# Altium schematic symbol library SCHLIB.SchLib: 2608 symbols (part 3 of 20) (continued)
## CTE-33 µF-25 V-2917 (continued)
CAP TANT 33UF 10% 25V 2917; Manufacturer Part Number: F931E336KNC; Manufacturer: KYOCERA AVX; Type: Molded; ESR: 700mOhm @ 100kHz; Lifetime @ Temp#: 2000 Hrs @ 125°C; Object  Type: Part; Design Item ID: CTE-33 µF-25 V-2917; Series: F93; Tolerance: ±10%; Operating Temperature: -55°C ~ 125°C; Mounting Type: Surface Mount; Package: 2917; Size: 7.30mm x 4.30mm; Height: 3.00mm; Features: General Purpose; Failure Rate: -; Category: Capacitor; Value: 33 µF
footprint CAPMP7343X310N
pins: 1, 2

## CTE-47 µF-25 V-2917
designator C?, comment Voltage - Rated: 25 V  Manufacturer Size Code: N  (hidden comment: 47 µF)
CAP TANT 47UF 10% 25V 2917; Manufacturer Part Number: F931E476KNC; Manufacturer: KYOCERA AVX; Type: Molded; ESR: 700mOhm @ 100kHz; Lifetime @ Temp#: 2000 Hrs @ 125°C; Object  Type: Part; Design Item ID: CTE-47 µF-25 V-2917; Series: F93; Tolerance: ±10%; Operating Temperature: -55°C ~ 125°C; Mounting Type: Surface Mount; Package: 2917; Size: 7.30mm x 4.30mm; Height: 3.00mm; Features: General Purpose; Failure Rate: -; Category: Capacitor; Value: 47 µF
footprint CAPMP7343X310N
pins: 1, 2

## CTE-68 µF-10 V-1411
designator C?, comment Voltage - Rated: 10 V  Manufacturer Size Code: B  (hidden comment: 68 µF)
CAP TANT 68UF 10% 10V 1411; Manufacturer Part Number: F931A686KBA; Manufacturer: KYOCERA AVX; Type: Molded; ESR: 900mOhm @ 100kHz; Lifetime @ Temp#: 2000 Hrs @ 125°C; Object  Type: Part; Design Item ID: CTE-68 µF-10 V-1411; Series: F93; Tolerance: ±10%; Operating Temperature: -55°C ~ 125°C; Mounting Type: Surface Mount; Package: 1411; Size: 3.50mm x 2.80mm; Height: 2.30mm; Features: General Purpose; Failure Rate: -; Category: Capacitor; Value: 68 µF
footprint CAPMP3528X210N
pins: 1, 2

## CTE-68 µF-10 V-2312
designator C?, comment Voltage - Rated: 10 V  Manufacturer Size Code: C  (hidden comment: 68 µF)
CAP TANT 68UF 10% 10V 2312; Manufacturer Part Number: F931A686KCC; Manufacturer: KYOCERA AVX; Type: Molded; ESR: 800mOhm @ 100kHz; Lifetime @ Temp#: 2000 Hrs @ 125°C; Object  Type: Part; Design Item ID: CTE-68 µF-10 V-2312; Series: F93; Value: 68 µF; Tolerance: ±10%; Operating Temperature: -55°C ~ 125°C; Mounting Type: Surface Mount; Package: 2312; Size: 6.00mm x 3.20mm; Height: 2.80mm; Features: General Purpose; Failure Rate: -; Category: Capacitor
footprint CAPMP6032X280N
pins: 1, 2

## CTE-100 µF-10 V-1411
designator C?, comment Voltage - Rated: 10 V  Manufacturer Size Code: B  (hidden comment: 100 µF)
CAP TANT 100UF 10% 10V 1411; Manufacturer Part Number: F931A107KBA; Manufacturer: KYOCERA AVX; Type: Molded; ESR: 1.2Ohm @ 100kHz; Lifetime @ Temp#: 2000 Hrs @ 125°C; Object  Type: Part; Design Item ID: CTE-100 µF-10 V-1411; Series: F93; Tolerance: ±10%; Operating Temperature: -55°C ~ 125°C; Mounting Type: Surface Mount; Package: 1411; Size: 3.50mm x 2.80mm; Height: 2.30mm; Features: General Purpose; Failure Rate: -; Category: Capacitor; Value: 100 µF
footprint CAPMP3528X210N
pins: 1, 2

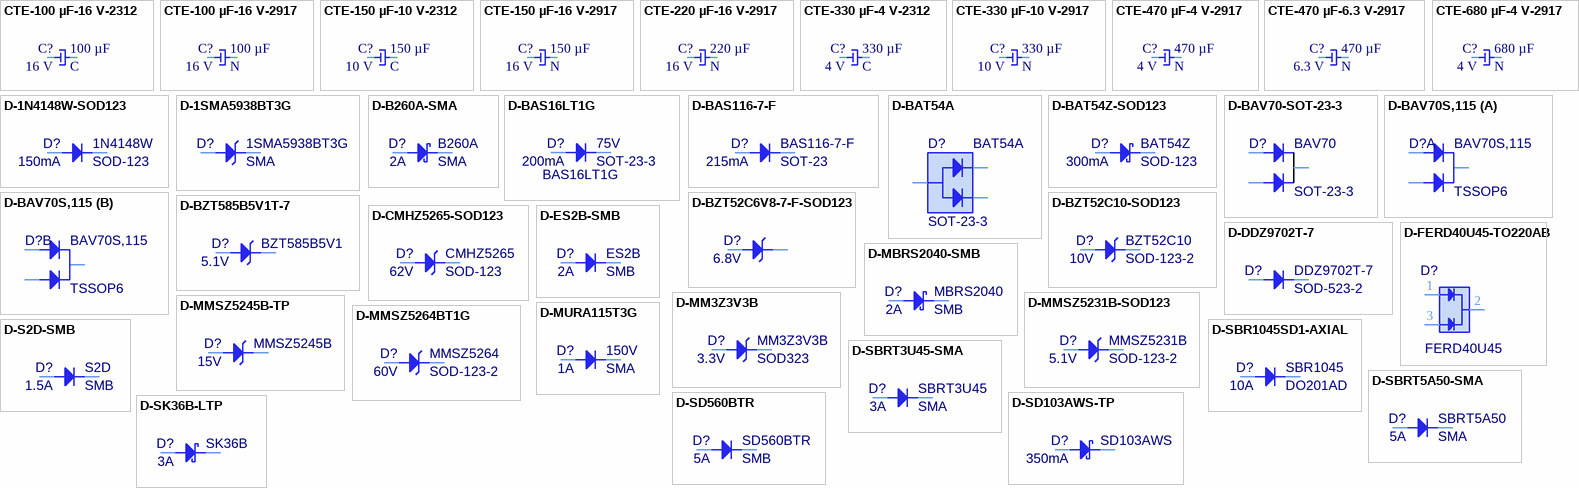
[diagram p11: symbols CTE-100 µF-16 V-2312 to D-SK36B-LTP]

## CTE-100 µF-16 V-2312
designator C?, comment Voltage - Rated: 16 V  Manufacturer Size Code: C  (hidden comment: 100 µF)
CAP TANT 100UF 10% 16V 2312; Manufacturer Part Number: F931C107KCC; Manufacturer: KYOCERA AVX; Type: Molded; ESR: 700mOhm @ 100kHz; Lifetime @ Temp#: 2000 Hrs @ 125°C; Object  Type: Part; Design Item ID: CTE-100 µF-16 V-2312; Series: F93; Tolerance: ±10%; Operating Temperature: -55°C ~ 125°C; Mounting Type: Surface Mount; Package: 2312; Size: 6.00mm x 3.20mm; Height: 2.80mm; Features: General Purpose; Failure Rate: -; Category: Capacitor; Value: 100 µF
footprint CAPMP6032X280N
pins: 1, 2

## CTE-100 µF-16 V-2917
designator C?, comment Voltage - Rated: 16 V  Manufacturer Size Code: N  (hidden comment: 100 µF)
CAP TANT 100UF 10% 16V 2917; Manufacturer Part Number: F931C107KNC; Manufacturer: KYOCERA AVX; Type: Molded; ESR: 600mOhm @ 100kHz; Lifetime @ Temp#: 2000 Hrs @ 125°C; Object  Type: Part; Design Item ID: CTE-100 µF-16 V-2917; Series: F93; Tolerance: ±10%; Operating Temperature: -55°C ~ 125°C; Mounting Type: Surface Mount; Package: 2917; Size: 7.30mm x 4.30mm; Height: 3.00mm; Features: General Purpose; Failure Rate: -; Category: Capacitor; Value: 100 µF
footprint CAPMP7343X310N
pins: 1, 2

## CTE-150 µF-10 V-2312
designator C?, comment Voltage - Rated: 10 V  Manufacturer Size Code: C  (hidden comment: 150 µF)
CAP TANT 150UF 10% 10V 2312; Manufacturer Part Number: F931A157KCC; Manufacturer: KYOCERA AVX; Type: Molded; ESR: 700mOhm @ 100kHz; Lifetime @ Temp#: 2000 Hrs @ 125°C; Object  Type: Part; Design Item ID: CTE-150 µF-10 V-2312; Series: F93; Tolerance: ±10%; Operating Temperature: -55°C ~ 125°C; Mounting Type: Surface Mount; Package: 2312; Size: 6.00mm x 3.20mm; Height: 2.80mm; Features: General Purpose; Failure Rate: -; Category: Capacitor; Value: 150 µF
footprint CAPMP6032X280N
pins: 1, 2

## CTE-150 µF-16 V-2917
designator C?, comment Voltage - Rated: 16 V  Manufacturer Size Code: N  (hidden comment: 150 µF)
CAP TANT 150UF 10% 16V 2917; Manufacturer Part Number: F931C157KNC; Manufacturer: KYOCERA AVX; Type: Molded; ESR: 600mOhm @ 100kHz; Lifetime @ Temp#: 2000 Hrs @ 125°C; Object  Type: Part; Design Item ID: CTE-150 µF-16 V-2917; Series: F93; Tolerance: ±10%; Operating Temperature: -55°C ~ 125°C; Mounting Type: Surface Mount; Package: 2917; Size: 7.30mm x 4.30mm; Height: 3.00mm; Features: General Purpose; Failure Rate: -; Category: Capacitor; Value: 150 µF
footprint CAPMP7343X310N
pins: 1, 2

## CTE-220 µF-16 V-2917
designator C?, comment Voltage - Rated: 16 V  Manufacturer Size Code: N  (hidden comment: 220 µF)
CAP TANT 220UF 10% 16V 2917; Manufacturer Part Number: F931C227KNC; Manufacturer: KYOCERA AVX; Type: Molded; ESR: 700mOhm @ 100kHz; Lifetime @ Temp#: 2000 Hrs @ 125°C; Object  Type: Part; Design Item ID: CTE-220 µF-16 V-2917; Series: F93; Tolerance: ±10%; Operating Temperature: -55°C ~ 125°C; Mounting Type: Surface Mount; Package: 2917; Size: 7.30mm x 4.30mm; Height: 3.00mm; Features: General Purpose; Failure Rate: -; Category: Capacitor; Value: 220 µF
footprint CAPMP7343X310N
pins: 1, 2

## CTE-330 µF-4 V-2312
designator C?, comment Voltage - Rated: 4 V  Manufacturer Size Code: C  (hidden comment: 330 µF)
CAP TANT 330UF 10% 4V 2312; Manufacturer Part Number: F930G337KCC; Manufacturer: KYOCERA AVX; Type: Molded; ESR: 700mOhm @ 100kHz; Lifetime @ Temp#: 2000 Hrs @ 125°C; Object  Type: Part; Design Item ID: CTE-330 µF-4 V-2312; Series: F93; Tolerance: ±10%; Operating Temperature: -55°C ~ 125°C; Mounting Type: Surface Mount; Package: 2312; Size: 6.00mm x 3.20mm; Height: 2.80mm; Features: General Purpose; Failure Rate: -; Category: Capacitor; Value: 330 µF
footprint CAPMP6032X280N
pins: 1, 2

## CTE-330 µF-10 V-2917
designator C?, comment Voltage - Rated: 10 V  Manufacturer Size Code: N  (hidden comment: 330 µF)
CAP TANT 330UF 10% 10V 2917; Manufacturer Part Number: F931A337KNC; Manufacturer: KYOCERA AVX; Type: Molded; ESR: 500mOhm @ 100kHz; Lifetime @ Temp#: 2000 Hrs @ 125°C; Object  Type: Part; Design Item ID: CTE-330 µF-10 V-2917; Series: F93; Value: 330 µF; Tolerance: ±10%; Operating Temperature: -55°C ~ 125°C; Mounting Type: Surface Mount; Package: 2917; Size: 7.30mm x 4.30mm; Height: 3.00mm; Features: General Purpose; Failure Rate: -; Category: Capacitor
footprint CAPMP7343X310N
pins: 1, 2

## CTE-470 µF-4 V-2917
designator C?, comment Voltage - Rated: 4 V  Manufacturer Size Code: N  (hidden comment: 470 µF)
CAP TANT 470UF 10% 4V 2917; Manufacturer Part Number: F930G477KNC; Manufacturer: KYOCERA AVX; Type: Molded; ESR: 300mOhm @ 100kHz; Lifetime @ Temp#: 2000 Hrs @ 125°C; Object  Type: Part; Design Item ID: CTE-470 µF-4 V-2917; Series: F93; Tolerance: ±10%; Operating Temperature: -55°C ~ 125°C; Mounting Type: Surface Mount; Package: 2917; Size: 7.30mm x 4.30mm; Height: 3.00mm; Features: General Purpose; Failure Rate: -; Category: Capacitor; Value: 470 µF
footprint CAPMP7343X310N
pins: 1, 2

## CTE-470 µF-6.3 V-2917
designator C?, comment Voltage - Rated: 6.3 V  Manufacturer Size Code: N  (hidden comment: 470 µF)
CAP TANT 470UF 10% 6.3V 2917; Manufacturer Part Number: F930J477KNC; Manufacturer: KYOCERA AVX; Type: Molded; ESR: 300mOhm @ 100kHz; Lifetime @ Temp#: 2000 Hrs @ 125°C; Object  Type: Part; Design Item ID: CTE-470 µF-6.3 V-2917; Series: F93; Tolerance: ±10%; Operating Temperature: -55°C ~ 125°C; Mounting Type: Surface Mount; Package: 2917; Size: 7.30mm x 4.30mm; Height: 3.00mm; Features: General Purpose; Failure Rate: -; Category: Capacitor; Value: 470 µF
footprint CAPMP7343X310N
pins: 1, 2

## CTE-680 µF-4 V-2917
designator C?, comment Manufacturer Size Code: N  Voltage - Rated: 4 V  (hidden comment: 680 µF)
CAP TANT 680UF 10% 4V 2917; Manufacturer Part Number: F930G687KNC; Manufacturer: KYOCERA AVX; Type: Molded; ESR: 300mOhm @ 100kHz; Lifetime @ Temp#: 2000 Hrs @ 125°C; Object  Type: Part; Design Item ID: CTE-680 µF-4 V-2917; Series: F93; Tolerance: ±10%; Operating Temperature: -55°C ~ 125°C; Mounting Type: Surface Mount; Package: 2917; Size: 7.30mm x 4.30mm; Height: 3.00mm; Features: General Purpose; Failure Rate: -; Category: Capacitor; Value: 680 µF
footprint CAPMP7343X310N
pins: 1, 2

## D-1N4148W-SOD123
designator D?, comment 1N4148W  Forward Current: 150mA  Package / Case: SOD-123
DIODE GEN PURP 100V 150MA SOD123; Manufacturer: MCC; Manufacturer Part Number: 1N4148W-TP; Max Surge Current: 2A; Forward Voltage: 1V; Recovery Time: 4ns; Max Reverse Leakage Current: 5uA; Power Dissipation: 400mW; Max Forward Surge Current (Ifsm): 1A; Element Configuration: Single; Polarity: Standard; Capacitance: 4pF; Washability: OK; Supplier 1: Digi-Key; Stock 1: 1558891; Pricing 1: 1=0.14, 10=0.131, 100=0.0856, 500=0.04186, 1000=0.02854 (USD); Mount: Surface Mount; Number of Pins: 2; Min Operating Temperature: -65°C; Max Operating Temperature: 150°C; Packaging: Tape and Reel; Package Quantity: 3000; Average Rectified Current: 150mA; Reverse Recovery Time: 4ns; Max Repetitive Reverse Voltage (Vrrm): 100V; Peak Non-Repetitive Surge Current: 2A; Voltage Rating (DC): 100V; Current Rating: 150mA; Output Current: 150mA; Max Reverse Voltage (DC): 100V; Length: 2.85mm; Height: 1.2mm; Width: 1.8mm; Radiation Hardening: No; REACH SVHC: Unknown; Lead Free: Lead Free; ComponentLink1URL: http://www.farnell.com/datasheets/1684829.pdf; ComponentLink1Description: http://www.farnell.com/datasheets/1684829.pdf; ComponentLink2URL: http://www.mccsemi.com/up_pdf/1N4148W(SOD123).pdf; ComponentLink2Description: http://www.mccsemi.com/up_pdf/1N4148W(SOD123).pdf; ComponentLink3URL: http://www.mouser.com/ds/2/258/1N4148W(SOD123)-349435.pdf; ComponentLink3Description: http://www.mouser.com/ds/2/258/1N4148W(SOD123)-349435.pdf; ComponentLink4URL: http://www.alliedelec.com/images/products/datasheets/bm/MCC/70055519.pdf; ComponentLink4Description: http://www.alliedelec.com/images/products/datasheets/bm/MCC/70055519.pdf; Supplier Part Number 1: 1N4148WTPMSDKR-ND; Parameter 2: *
footprint D-SOD123
pins: A, C

## D-1SMA5938BT3G
designator D?, comment 1SMA5938BT3G  Case/Package: SMA
DIODE ZENER 36V 1.5W SMA; Manufacturer: ON Semiconductor; Tolerance: 5%; Max Reverse Leakage Current: 500nA; Impedance: 38R; Test Current: 10.4mA; Element Configuration: Single; ESD Protection: Yes; Forward Voltage: 1.5V; Zener Current: 42mA; Power Dissipation: 500mW; Washability: OK; Supplier 1: Digi-Key; Manufacturer Part Number: 1SMA5938BT3G; Stock 1: 6046; Pricing 1: 1=0.5, 10=0.374, 100=0.233, 500=0.15944, 1000=0.12264 (USD); Number of Pins: 2; Contact Plating: Matte,Tin; Min Operating Temperature: -65°C; Max Operating Temperature: 150°C; Max Power Dissipation: 1.5W; Package Quantity: 1; Packaging: Tape and Reel; Zener Voltage: 36V; Voltage Tolerance: 5%; Working Voltage: 36V; Peak Reverse Current: 500nA; Power Rating: 1.5W; Voltage Rating (DC): 36V; Length: 4.57mm; Height: 2.05mm; Width: 2.92mm; Radiation Hardening: No; Lead Free: Lead Free; Halogen Free: Halogen Free; REACH SVHC: No SVHC; ComponentLink1URL: http://www.onsemi.com/pub_link/Collateral/1SMA5913BT3-D.PDF; ComponentLink1Description: http://www.onsemi.com/pub_link/Collateral/1SMA5913BT3-D.PDF; ComponentLink2URL: http://www.onsemi.com/pub/Collateral/1SMA5913BT3-D.PDF; ComponentLink2Description: http://www.onsemi.com/pub/Collateral/1SMA5913BT3-D.PDF; ComponentLink3URL: https://www.onsemi.com/pub/Collateral/1SMA5913BT3-D.PDF; ComponentLink3Description: https://www.onsemi.com/pub/Collateral/1SMA5913BT3-D.PDF; Supplier Part Number 1: 1SMA5938BT3GOSDKR-ND
footprint D-SMA-DO214AC
pins: A, C

## D-B260A-SMA
designator D?, comment B260A  Average Rectified Current: 2A  Case/Package: SMA
DIODE SCHOTTKY 60V 2A SMA; Manufacturer: Diodes; Manufacturer Part Number: B260A-13-F; Forward Voltage: 700mV; Peak Reverse Current: 500uA; Max Forward Surge Current (Ifsm): 50A; Element Configuration: Single; Polarity: Standard; Capacitance: 200pF; Washability: OK; Supplier 1: Digi-Key; Supplier Part Number 1: B260A-FDICT-ND; Stock 1: 380908; Pricing 1: 1=0.48, 10=0.359, 100=0.2239, 500=0.15318, 1000=0.11783 (USD); Mount: Surface Mount; Number of Pins: 2; Weight: 0.002258oz; Contact Plating: Matte,Tin; Min Operating Temperature: -65°C; Max Operating Temperature: 150°C; Packaging: Tape and Reel; Forward Current: 2A; Package Quantity: 5000; Max Repetitive Reverse Voltage (Vrrm): 60V; Peak Non-Repetitive Surge Current: 50A; Termination: SMD/SMT; Voltage Rating (DC): 60V; Current Rating: 2A; Output Current: 2A; Max Reverse Voltage (DC): 60V; Length: 4.6mm; Height: 2.1mm; Width: 2.92mm; Radiation Hardening: No; REACH SVHC: No SVHC; Lead Free: Lead Free; ComponentLink1URL: https://www.verical.com/server-webapp/html/getDatasheet?partID=143171; ComponentLink1Description: https://www.verical.com/server-webapp/html/getDatasheet?partID=143171; ComponentLink2URL: http://www.diodes.com/datasheets/ds13004.pdf; ComponentLink2Description: http://www.diodes.com/datasheets/ds13004.pdf; ComponentLink3URL: http://www.jameco.com/Jameco/Products/ProdDS/1589515.pdf; ComponentLink3Description: http://www.jameco.com/Jameco/Products/ProdDS/1589515.pdf
footprint D-SMA-DO214AC
pins: A, C

## D-BAS16LT1G
designator D?, comment BAS16LT1G  Case/Package: SOT-23-3  Forward Current: 200mA  Voltage Rating (DC): 75V
DIODE GEN PURP 75V 200MA SOT23-3; Manufacturer 1: ON Semiconductor; Element Configuration: Single; Peak Reverse Current: 1uA; Reverse Recovery Time: 6ns; Max Surge Current: 500mA; Forward Voltage: 1.25V; Power Dissipation: 300mW; Polarity: Standard; Capacitance: 2pF; Washability: OK; Supplier 1: Digi-Key; Manufacturer Part Number 1: BAS16LT1G; Stock 1: 1477489; Pricing 1: 1=0,10000, 10=0,09200, 100=0,03850, 500=0,03024, 1000=0,02100 (USD); RoHS: Yes; Number of Pins: 3; Contact Plating: Tin,Matte; Min Operating Temperature: -55°C; Max Operating Temperature: 150°C; Max Repetitive Reverse Voltage (Vrrm): 75V; Recovery Time: 6ns; Package Quantity: 1; Packaging: Tape and Reel; Max Reverse Leakage Current: 1uA; Average Rectified Current: 200mA; Max Reverse Voltage (DC): 75V; Peak Non-Repetitive Surge Current: 500mA; Max Forward Surge Current (Ifsm): 500mA; Current Rating: 200mA; Output Current: 200mA; Length: 0.119inch; Height: 0.04inch; Width: 0.055inch; Radiation Hardening: No; Lead Free: Lead Free; Halogen Free: Halogen Free; REACH SVHC: No SVHC; ComponentLink1URL: https://datasheet.ciiva.com/4434/bas16lt1-d-103448-4434931.pdf?src-supplier=Mouser; ComponentLink1Description: https://datasheet.ciiva.com/4434/bas16lt1-d-103448-4434931.pdf?src-supplier=Mouser; ComponentLink2URL: https://datasheet.ciiva.com/915/bas16lt1-d-915318.pdf?src-supplier=Digi-Key; ComponentLink2Description: https://datasheet.ciiva.com/915/bas16lt1-d-915318.pdf?src-supplier=Digi-Key; ComponentLink3URL: https://datasheet.ciiva.com/1179/bas16lt1-d-1179718.pdf?src-supplier=Element14; ComponentLink3Description: https://datasheet.ciiva.com/1179/bas16lt1-d-1179718.pdf?src-supplier=Element14; ComponentLink4URL: https://datasheet.ciiva.com/8291/bas16lt1-d-8291894.pdf?src-supplier=Avnet; ComponentLink4Description: https://datasheet.ciiva.com/8291/bas16lt1-d-8291894.pdf?src-supplier=Avnet; ComponentLink5URL: https://datasheet.ciiva.com/915/bas16lt1-d-915319.pdf?src-supplier=Digi-Key; ComponentLink5Description: https://datasheet.ciiva.com/915/bas16lt1-d-915319.pdf?src-supplier=Digi-Key; ComponentLink6URL: https://datasheet.ciiva.com/1179/bas16lt1-d-1179719.pdf?src-supplier=Element14; ComponentLink6Description: https://datasheet.ciiva.com/1179/bas16lt1-d-1179719.pdf?src-supplier=Element14; ComponentLink7URL: https://datasheet.ciiva.com/915/bas16lt1-d-915320.pdf?src-supplier=Digi-Key; ComponentLink7Description: https://datasheet.ciiva.com/915/bas16lt1-d-915320.pdf?src-supplier=Digi-Key; ComponentLink8URL: https://datasheet.ciiva.com/16387/bas16lt1-d-16387673.pdf?src-supplier=Future+Electronics; ComponentLink8Description: https://datasheet.ciiva.com/16387/bas16lt1-d-16387673.pdf?src-supplier=Future+Electronics; ComponentLink9URL: https://datasheet.ciiva.com/22663/1708231-22663642.pdf?src-supplier=Element14; ComponentLink9Description: https://datasheet.ciiva.com/22663/1708231-22663642.pdf?src-supplier=Element14; ComponentLink10URL: https://datasheet.ciiva.com/25950/bas16lt1-d-25950207.pdf?src-supplier=Avnet+Europe; ComponentLink10Description: https://datasheet.ciiva.com/25950/bas16lt1-d-25950207.pdf?src-supplier=Avnet+Europe; Supplier Part Number 1: BAS16LT1GOSCT-ND
footprint SOT23-3
pins: 1 A, 3 K

## D-BAS116-7-F
designator D?, comment BAS116-7-F  Case/Package: SOT-23  Forward Current: 215mA
DIODE GEN PURP 85V 215MA SOT23-3; Manufacturer: Diodes; Reverse Recovery Time: 3us; Peak Non-Repetitive Surge Current: 4A; Element Configuration: Single; Forward Voltage: 1.25V; Max Reverse Current: 5nA; Max Power Dissipation: 150mW; Power Dissipation: 250mW; Polarity: Standard; Capacitance: 2pF; Output Current: 250mA; Supplier 1: Digi-Key; Manufacturer Part Number: BAS116-7-F; Stock 1: 48988; Pricing 1: 1=0,20000, 10=0,17700, 100=0,08340, 500=0,04950, 1000=0,03323 (USD); RoHS: Yes; Mount: Surface Mount; Number of Pins: 3; Weight: 0.000282oz; Contact Plating: Tin,Matte; Min Operating Temperature: -65°C; Max Operating Temperature: 150°C; Max Repetitive Reverse Voltage (Vrrm): 85V; Max Surge Current: 4A; Package Quantity: 3000; Packaging: Tape and Reel; Recovery Time: 3us; Reverse Voltage (DC): 85V; Average Rectified Current: 215mA; Max Forward Surge Current (Ifsm): 4A; Voltage Rating (DC): 85V; Power Rating: 250mW; Current Rating: 215mA; Max Reverse Voltage (DC): 85V; Length: 3.05mm; Height: 1mm; Width: 1.4mm; Radiation Hardening: No; REACH SVHC: No SVHC; Lead Free: Lead Free; ComponentLink1URL: https://datasheet.ciiva.com/911/ds30233-911846.pdf?src-supplier=Digi-Key; ComponentLink1Description: https://datasheet.ciiva.com/911/ds30233-911846.pdf?src-supplier=Digi-Key; ComponentLink2URL: https://datasheet.ciiva.com/1179/ds30233-1179654.pdf?src-supplier=Element14; ComponentLink2Description: https://datasheet.ciiva.com/1179/ds30233-1179654.pdf?src-supplier=Element14; ComponentLink3URL: https://datasheet.ciiva.com/15144/getdatasheetpartid-35589-15144022.pdf?src-supplier=Verical; ComponentLink3Description: https://datasheet.ciiva.com/15144/getdatasheetpartid-35589-15144022.pdf?src-supplier=Verical; ComponentLink4URL: https://datasheet.ciiva.com/911/ds30233-911847.pdf?src-supplier=Digi-Key; ComponentLink4Description: https://datasheet.ciiva.com/911/ds30233-911847.pdf?src-supplier=Digi-Key; ComponentLink5URL: https://datasheet.ciiva.com/911/ds30233-911848.pdf?src-supplier=Digi-Key; ComponentLink5Description: https://datasheet.ciiva.com/911/ds30233-911848.pdf?src-supplier=Digi-Key; ComponentLink6URL: https://datasheet.ciiva.com/4453/ds30233-18535-4453579.pdf?src-supplier=Mouser; ComponentLink6Description: https://datasheet.ciiva.com/4453/ds30233-18535-4453579.pdf?src-supplier=Mouser; ComponentLink7URL: https://datasheet.ciiva.com/8303/ds30233-8303195.pdf?src-supplier=Avnet; ComponentLink7Description: https://datasheet.ciiva.com/8303/ds30233-8303195.pdf?src-supplier=Avnet
footprint SOT23-3
pins: A, C

## D-BAT54A
designator D?, comment BAT54A  Case/Package: SOT-23-3
DIODE ARRAY SCHOTTKY 30V SOT23-3; Manufacturer: ON Semiconductor / Fairchild; Forward Voltage: 800mV; Element Configuration: Common Anode; Current Rating: 200mA; Reverse Recovery Time: 5ns; Max Forward Surge Current (Ifsm): 600mA; Capacitance: 10pF; Peak Reverse Current: 2uA; Power Dissipation: 290mW; Washability: OK; Supplier 1: Digi-Key; Manufacturer Part Number: BAT54A; Stock 1: 29533; Pricing 1: 1=0.28, 10=0.23, 100=0.122, 500=0.08028, 1000=0.05459 (USD); Mount: Surface Mount; Number of Pins: 3; Weight: 0.025g; Contact Plating: Matte,Tin; Min Operating Temperature: -55°C; Max Operating Temperature: 150°C; Packaging: Tape and Reel; Voltage Rating (DC): 30V; Forward Current: 200mA; Max Repetitive Reverse Voltage (Vrrm): 30V; Package Quantity: 1; Peak Non-Repetitive Surge Current: 600mA; Average Rectified Current: 200mA; Max Reverse Voltage (DC): 30V; Length: 2.92mm; Height: 0.93mm; Width: 1.3mm; Radiation Hardening: No; REACH SVHC: No SVHC; Lead Free: Lead Free; ComponentLink1URL: http://www.farnell.com/datasheets/2285880.pdf; ComponentLink1Description: http://www.farnell.com/datasheets/2285880.pdf; ComponentLink2URL: https://www.fairchildsemi.com/package-drawings/MA/MA03B.pdf; ComponentLink2Description: https://www.fairchildsemi.com/package-drawings/MA/MA03B.pdf; ComponentLink3URL: http://www.fairchildsemi.com/ds/BA/BAT54A.pdf; ComponentLink3Description: http://www.fairchildsemi.com/ds/BA/BAT54A.pdf; ComponentLink4URL: https://www.verical.com/server-webapp/html/getDatasheet?partID=86888; ComponentLink4Description: https://www.verical.com/server-webapp/html/getDatasheet?partID=86888; ComponentLink5URL: https://media.digikey.com/pdf/Data%20Sheets/ON%20Semiconductor%20PDFs/BAT54(A,C,S).pdf; ComponentLink5Description: https://media.digikey.com/pdf/Data%20Sheets/ON%20Semiconductor%20PDFs/BAT54(A,C,S).pdf; Supplier Part Number 1: BAT54AFSDKR-ND
footprint SOT23-3
pins: 1, 2, 3

## D-BAT54Z-SOD123
designator D?, comment BAT54Z  Average Rectified Current: 300mA  Package / Case: SOD-123
DIODE SCHOTTKY 40V 300MA SOD123; Manufacturer: STMicroelectronics; Manufacturer Part Number: BAT54ZFILM; Forward Voltage: 900mV; Max Surge Current: 1A; Recovery Time: 5ns; Max Reverse Leakage Current: 1uA; Peak Reverse Current: 100uA; Element Configuration: Single; Polarity: Standard; Capacitance: 7pF; Washability: OK; Supplier 1: Digi-Key; Supplier Part Number 1: 497-5562-6-ND; Stock 1: 43044; Pricing 1: 1=0.35, 10=0.26, 100=0.147, 500=0.09734, 1000=0.07462 (USD); Mount: Surface Mount; Number of Pins: 2; Contact Plating: Matte,Tin; Min Operating Temperature: -40°C; Max Operating Temperature: 150°C; Package Quantity: 1; Packaging: Tape and Reel; Reverse Recovery Time: 5ns; Max Repetitive Reverse Voltage (Vrrm): 40V; Peak Non-Repetitive Surge Current: 1A; Voltage Rating (DC): 40V; Current Rating: 300mA; Output Current: 300mA; Forward Current: 300mA; Max Reverse Voltage (DC): 40V; Lead Free: Lead Free; ComponentLink1URL: http://www.st.com/web/en/resource/technical/document/datasheet/CD00001322.pdf; ComponentLink1Description: http://www.st.com/web/en/resource/technical/document/datasheet/CD00001322.pdf; ComponentLink2URL: http://www.st.com/content/ccc/resource/technical/document/datasheet/07/50/54/f2/0d/ba/4a/79/CD00001322.pdf/files/CD00001322.pdf/jcr:content/translations/en.CD00001322.pdf; ComponentLink2Description: http://www.st.com/content/ccc/resource/technical/document/datasheet/07/50/54/f2/0d/ba/4a/79/CD00001322.pdf/files/CD00001322.pdf/jcr:content/translations/en.CD00001322.pdf
footprint D-SOD123
pins: A, C

## D-BAV70-SOT-23-3
designator D?, comment BAV70  Case/Package: SOT-23-3
DIODE ARRAY GP 80V 200MA SOT23-3 3; Manufacturer: Panasonic; Max Surge Current: 500mA; Recovery Time: 2ns; Element Configuration: Common Cathode; Max Reverse Leakage Current: 100nA; Voltage Rating (DC): 70V; Capacitance: 1.5pF; Forward Voltage: 1V; Washability: OK; Supplier 1: Digi-Key; Supplier Part Number 1: BAV70PSCT-ND; Manufacturer Part Number: BAV70; Stock 1: 0; Mount: Surface Mount; Number of Pins: 3; Min Operating Temperature: -40°C; Max Operating Temperature: 85°C; Packaging: Tape and Reel; Package Quantity: 3000; Average Rectified Current: 200mA; Current Rating: 200mA; Max Reverse Voltage (DC): 80V; REACH SVHC: No SVHC; Lead Free: Lead Free; ComponentLink1URL: http://www.mouser.com/ds/2/315/BAV70_E-472112.pdf; ComponentLink1Description: http://www.mouser.com/ds/2/315/BAV70_E-472112.pdf
footprint SOT23-3
pins: 1, 2, 3

## D-BAV70S,115
designator D?, comment BAV70S,115  Case/Package: TSSOP6
DIODE ARRAY GP 100V 250MA 6TSSOP; Manufacturer: NXP Semiconductors; Element Configuration: Common Cathode; Forward Voltage: 1.25V; Reverse Recovery Time: 4ns; Peak Non-Repetitive Surge Current: 4A; Peak Reverse Current: 500nA; Power Dissipation: 350mW; Washability: OK; Supplier 1: Digi-Key; Manufacturer Part Number: BAV70S,115; Stock 1: 142855; Pricing 1: 1=0.42, 10=0.315, 100=0.1786, 500=0.11828, 1000=0.09068 (USD); Mount: Surface Mount; Number of Pins: 6; Weight: 0.01lb; Contact Plating: Tin; Min Operating Temperature: -65°C; Max Operating Temperature: 150°C; Packaging: Tape and Reel; Forward Current: 250mA; Max Repetitive Reverse Voltage (Vrrm): 100V; Package Quantity: 1; Max Surge Current: 4A; Recovery Time: 4ns; Average Rectified Current: 250mA; Max Reverse Leakage Current: 500nA; Max Forward Surge Current (Ifsm): 4A; Max Reverse Voltage (DC): 100V; Length: 2.2mm; Height: 1mm; Width: 1.35mm; Radiation Hardening: No; REACH SVHC: No SVHC; Lead Free: Lead Free; ComponentLink1URL: http://www.nxp.com/documents/data_sheet/BAV70_SER.pdf; ComponentLink1Description: http://www.nxp.com/documents/data_sheet/BAV70_SER.pdf; ComponentLink2URL: http://www.farnell.com/datasheets/1914003.pdf; ComponentLink2Description: http://www.farnell.com/datasheets/1914003.pdf; Supplier Part Number 1: 1727-4310-6-ND
footprint TSSOP6(SOT363)
part A pins: 1, 2, 6
part B pins: 3, 4, 5

## D-BZT52C6V8-7-F-SOD123
designator D?, comment Voltage Rating (DC): 6.8V  (hidden comment: BZT52C6V8)
DIODE ZENER 6.8V 500MW SOD123; Manufacturer: Diodes; Manufacturer Part Number: BZT52C6V8-7-F; Max Reverse Leakage Current: 2uA; Element Configuration: Single; Tolerance: 6%; Forward Voltage: 900mV; Impedance: 15R; Zener Current: 5mA; Output Current: 45mA; ESD Protection: No; Washability: OK; Supplier 1: Digi-Key; Stock 1: 28515; Pricing 1: 1=0.20000, 10=0.16600, 100=0.08810, 500=0.05794, 1000=0.03940 (USD); RoHS: Yes; Mount: Surface Mount; Number of Pins: 2; Weight: 0.000353oz; Contact Plating: Tin,Matte; Min Operating Temperature: -65°C; Max Operating Temperature: 150°C; Max Power Dissipation: 500mW; Zener Voltage: 6.8V; Packaging: Tape and Reel; Package Quantity: 3000; Power Dissipation: 500mW; Voltage Tolerance: 6%; Test Current: 5mA; Working Voltage: 6.8V; Peak Reverse Current: 2uA; Termination: SMD/SMT; Power Rating: 500mW; Length: 2.85mm; Height: 1.35mm; Width: 1.7mm; Radiation Hardening: No; Lead Free: Lead Free; ComponentLink1URL: https://datasheet.ciiva.com/15142/getdatasheetpartid-61176-15142294.pdf?src-supplier=Verical; ComponentLink1Description: https://datasheet.ciiva.com/15142/getdatasheetpartid-61176-15142294.pdf?src-supplier=Verical; ComponentLink2URL: https://datasheet.ciiva.com/25623/0900766b8104bde6-25623750.pdf?src-supplier=RSComponents; ComponentLink2Description: https://datasheet.ciiva.com/25623/0900766b8104bde6-25623750.pdf?src-supplier=RSComponents; Supplier Part Number 1: BZT52C6V8-FDICT-ND
footprint D-SOD123
pins: A, C

## D-BZT52C10-SOD123
designator D?, comment BZT52C10  Zener Voltage: 10V  Case/Package: SOD-123-2
DIODE ZENER 10V 500MW SOD123; Manufacturer: Diodes; Manufacturer Part Number: BZT52C10-7-F; Tolerance: 6%; Forward Voltage: 900mV; Impedance: 20R; Zener Current: 5mA; Peak Reverse Current: 200nA; Element Configuration: Single; Output Current: 50mA; ESD Protection: No; Forward Current: 250mA; Reverse Recovery Time: 4ns; Max Repetitive Reverse Voltage (Vrrm): 100V; Peak Non-Repetitive Surge Current: 4A; Washability: OK; Supplier 1: Digi-Key; Supplier Part Number 1: BZT52C10-FDIDKR-ND; Stock 1: 339; Pricing 1: 1=0.24, 10=0.218, 100=0.1186, 500=0.07296, 1000=0.04975 (USD); Mount: Surface Mount; Number of Pins: 2; Weight: 0.000353oz; Contact Plating: Matte,Tin; Min Operating Temperature: -65°C; Max Operating Temperature: 150°C; Package Quantity: 3000; Packaging: Tape and Reel; Max Power Dissipation: 500mW; Voltage Tolerance: 6%; Test Current: 5mA; Power Dissipation: 500mW; Max Reverse Leakage Current: 200nA; Working Voltage: 10V; Termination: SMD/SMT; Power Rating: 500mW; Voltage Rating (DC): 10V; Length: 2.85mm; Height: 1.35mm; Width: 1.7mm; Radiation Hardening: No; Lead Free: Lead Free; ComponentLink1URL: https://www.diodes.com/assets/Datasheets/ds18004.pdf; ComponentLink1Description: https://www.diodes.com/assets/Datasheets/ds18004.pdf; ComponentLink2URL: http://www.jameco.com/Jameco/Products/ProdDS/1539497.pdf; ComponentLink2Description: http://www.jameco.com/Jameco/Products/ProdDS/1539497.pdf; Supplier 2: Digi-Key; Supplier Part Number 2: MMSZ5240B-FDIDKR-ND; Stock 2: 34933; Pricing 2: 1=0.25, 10=0.204, 100=0.108, 500=0.07108, 1000=0.04833 (USD); ComponentLink3URL: https://www.verical.com/server-webapp/html/getDatasheet?partID=110273; ComponentLink3Description: https://www.verical.com/server-webapp/html/getDatasheet?partID=110273; ComponentLink4URL: http://www.diodes.com/_files/datasheets/ds18010.pdf; ComponentLink4Description: http://www.diodes.com/_files/datasheets/ds18010.pdf; ComponentLink5URL: http://www.jameco.com/Jameco/Products/ProdDS/1541167.pdf; ComponentLink5Description: http://www.jameco.com/Jameco/Products/ProdDS/1541167.pdf; Supplier 3: Digi-Key; Supplier Part Number 3: MMSZ5240B-HE3-08GICT-ND; Stock 3: 14290; Pricing 3: 1=0.3, 10=0.244, 25=0.2044, 100=0.1295, 250=0.09992, 500=0.08516, 1000=0.05791 (USD); ComponentLink6URL: http://www.mouser.com/ds/2/427/mmsz5225-102133.pdf; ComponentLink6Description: http://www.mouser.com/ds/2/427/mmsz5225-102133.pdf; Max Surge Current: 4A; Recovery Time: 4ns; Average Rectified Current: 250mA; Max Forward Surge Current (Ifsm): 4A; Max Reverse Voltage (DC): 100V; REACH SVHC: No SVHC; ComponentLink7URL: http://www.nxp.com/documents/data_sheet/BAV70_SER.pdf; ComponentLink7Description: http://www.nxp.com/documents/data_sheet/BAV70_SER.pdf; ComponentLink8URL: http://www.farnell.com/datasheets/1914003.pdf; ComponentLink8Description: http://www.farnell.com/datasheets/1914003.pdf
footprint D-SOD123
pins: A, C

## D-BZT585B5V1T-7
designator D?, comment BZT585B5V1  Zener Voltage: 5.1V
DIODE ZENER 5.1V 350MW SOD523; Manufacturer: Diodes; Manufacturer Part Number: BZT585B5V1T-7; Impedance: 60R; Tolerance: 2%; Element Configuration: Single; Zener Current: 5mA; Peak Reverse Current: 2uA; Forward Voltage: 900mV; ESD Protection: No; Washability: OK; Supplier 1: Digi-Key; Stock 1: 6784; Pricing 1: 1=0.22000, 10=0.18000, 100=0.09570, 500=0.06296, 1000=0.04281 (USD); RoHS: Yes; Mount: Surface Mount; Case/Package: SOD-523-2; Number of Pins: 2; Weight: 3.5E-05oz; Contact Plating: Tin,Matte; Min Operating Temperature: -65°C; Max Operating Temperature: 150°C; Packaging: Tape and Reel; Max Power Dissipation: 350mW; Voltage Tolerance: 2%; Package Quantity: 3000; Max Reverse Leakage Current: 2uA; Test Current: 5mA; ComponentLink1URL: http://www.mouser.com/ds/2/115/BZT585BxVxT-318149.pdf?src-supplier=Mouser; ComponentLink1Description: http://www.mouser.com/ds/2/115/BZT585BxVxT-318149.pdf?src-supplier=Mouser; ComponentLink2URL: https://www.diodes.com/assets/Datasheets/BZT585BxVxT.pdf?src-supplier=Digi-Key; ComponentLink2Description: https://www.diodes.com/assets/Datasheets/BZT585BxVxT.pdf?src-supplier=Digi-Key; ComponentLink3URL: http://diodes.com/datasheets/BZT585BxVxT.pdf?src-supplier=Avnet; ComponentLink3Description: http://diodes.com/datasheets/BZT585BxVxT.pdf?src-supplier=Avnet; Supplier Part Number 1: BZT585B5V1T-7DICT-ND
footprint D-SOD523
pins: A, C

## D-CMHZ5265-SOD123
designator D?, comment CMHZ5265  Zener Voltage: 62V  Package / Case: SOD-123
DIODE ZENER 62V 250MW SOD123; Manufacturer: Central Semiconductor; Manufacturer Part Number: CMHZ5265BTR; Impedance: 185R; Tolerance: 5%; Material: Plastic; Max Reverse Leakage Current: 100nA; Test Current: 2mA; Element Configuration: Single; Forward Voltage: 900mV; Power Dissipation: 500mW; Zener Current: 10mA; ESD Protection: Yes; Washability: OK; Supplier 1: Digi-Key; Supplier Part Number 1: CMHZ5265BDKR-ND; Stock 1: 29816; Pricing 1: 1=0.49, 10=0.415, 25=0.3632, 100=0.3115, 250=0.26996, 500=0.22842, 1000=0.1765 (USD); Mount: Surface Mount; Min Operating Temperature: -65°C; Max Operating Temperature: 150°C; Packaging: Tape and Reel; Max Power Dissipation: 250mW; Supplier 2: Digi-Key; Supplier Part Number 2: MMSZ5265BT1GOSDKR-ND; Stock 2: 630; Pricing 2: 1=0.25, 10=0.201, 100=0.1067, 500=0.07016, 1000=0.04771 (USD); Case/Package: SOD-123-2; Number of Pins: 2; Contact Plating: Matte,Tin; Package Quantity: 1; Voltage Tolerance: 5%; Working Voltage: 62V; Peak Reverse Current: 100nA; Voltage Rating (DC): 62V; Power Rating: 500mW; Length: 2.84mm; Height: 1.25mm; Width: 1.8mm; Radiation Hardening: No; Lead Free: Lead Free; REACH SVHC: No SVHC; ComponentLink1URL: https://www.verical.com/server-webapp/html/getDatasheet?partID=75754; ComponentLink1Description: https://www.verical.com/server-webapp/html/getDatasheet?partID=75754; ComponentLink2URL: http://www.onsemi.com/pub/Collateral/MMSZ5221BT1-D.PDF; ComponentLink2Description: http://www.onsemi.com/pub/Collateral/MMSZ5221BT1-D.PDF; ComponentLink3URL: http://www.farnell.com/datasheets/661777.pdf; ComponentLink3Description: http://www.farnell.com/datasheets/661777.pdf; ComponentLink4URL: http://www.mouser.com/ds/2/308/MMSZ5221BT1-D-85810.pdf; ComponentLink4Description: http://www.mouser.com/ds/2/308/MMSZ5221BT1-D-85810.pdf
footprint D-SOD123
pins: A, C

## D-DDZ9702T-7
designator D?, comment DDZ9702T-7  Case/Package: SOD-523-2
DIODE ZENER 15V 150MW SOD523; Manufacturer: Diodes; Max Reverse Leakage Current: 50nA; Element Configuration: Single; Tolerance: 5%; Test Current: 50uA; Forward Voltage: 900mV; Washability: OK; Supplier 1: Digi-Key; Manufacturer Part Number: DDZ9702T-7; Stock 1: 53168; Pricing 1: 1=0.51, 10=0.379, 100=0.2146, 500=0.14214, 1000=0.10897 (USD); Mount: Surface Mount; Number of Pins: 2; Weight: 3.5E-05oz; Min Operating Temperature: -65°C; Max Operating Temperature: 150°C; Max Power Dissipation: 150mW; Zener Voltage: 15V; Package Quantity: 3000; Packaging: Tape and Reel; Voltage Tolerance: 5%; Power Dissipation: 150mW; Zener Current: 50nA; Peak Reverse Current: 50nA; Power Rating: 150mW; Length: 1.7mm; Height: 0.65mm; Width: 0.9mm; Radiation Hardening: No; Lead Free: Lead Free; ComponentLink1URL: http://www.diodes.com///datasheets/ds30553.pdf; ComponentLink1Description: http://www.diodes.com///datasheets/ds30553.pdf; Supplier Part Number 1: DDZ9702T-7DIDKR-ND
pins: A, C

## D-ES2B-SMB
designator D?, comment ES2B  Forward Current: 2A  Case/Package: SMB
DIODE GEN PURP 100V 2A DO214AA-SMB; Manufacturer: ON Semiconductor / Fairchild; Forward Voltage: 900mV; Polarity: Standard; Capacitance: 18pF; Max Surge Current: 50A; Peak Reverse Current: 10uA; Recovery Time: 20ns; Power Dissipation: 1.66W; Element Configuration: Single; Washability: OK; Supplier 1: Digi-Key; Supplier Part Number 1: ES2BFSDKR-ND; Manufacturer Part Number: ES2B; Stock 1: 8342; Pricing 1: 1=0.46, 10=0.371, 100=0.2526, 500=0.18948, 1000=0.14211 (USD); Mount: Surface Mount; Number of Pins: 2; Weight: 0.18g; Min Operating Temperature: -55°C; Max Operating Temperature: 150°C; Packaging: Tape and Reel; Voltage Rating (DC): 100V; Current Rating: 2A; Output Current: 2A; Package Quantity: 1; Average Rectified Current: 2A; Reverse Recovery Time: 20ns; Max Repetitive Reverse Voltage (Vrrm): 100V; Peak Non-Repetitive Surge Current: 50A; Max Forward Surge Current (Ifsm): 50A; Reverse Voltage: 100V; Max Reverse Voltage (DC): 100V; Length: 4.75mm; Height: 2.45mm; Width: 3.95mm; Radiation Hardening: No; REACH SVHC: No SVHC; Lead Free: Lead Free; ComponentLink1URL: http://www.jameco.com/Jameco/Products/ProdDS/1220689.pdf; ComponentLink1Description: http://www.jameco.com/Jameco/Products/ProdDS/1220689.pdf; ComponentLink2URL: https://www.fairchildsemi.com/datasheets/ES/ES2D.pdf; ComponentLink2Description: https://www.fairchildsemi.com/datasheets/ES/ES2D.pdf; ComponentLink3URL: http://www.mouser.com/ds/2/149/ES2B-190295.pdf; ComponentLink3Description: http://www.mouser.com/ds/2/149/ES2B-190295.pdf; ComponentLink4URL: https://www.fairchildsemi.com/package-drawings/DO/DO214AA.pdf; ComponentLink4Description: https://www.fairchildsemi.com/package-drawings/DO/DO214AA.pdf; ComponentLink5URL: http://www.farnell.com/datasheets/1845305.pdf; ComponentLink5Description: http://www.farnell.com/datasheets/1845305.pdf
footprint D-SMB-DO214AA
pins: A, C

## D-FERD40U45-TO220AB
designator D?, comment FERD40U45
DIODE ARRAY 45V 20A TO220AB; Manufacturer: STMicroelectronics; Manufacturer Part Number: FERD40U45CT; Element Configuration: Common Cathode; Peak Reverse Current: 50mA; Max Surge Current: 275A; Forward Current: 40A; Forward Voltage: 460mV; Washability: OK; Supplier 1: Digi-Key; Supplier Part Number 1: 497-14549-5-ND; Stock 1: 0; Pricing 1: 1=1.67, 50=1.4122, 100=1.2032, 500=0.98858, 1000=0.81911 (USD); Mount: Through Hole; Number of Pins: 3; Weight: 0.08113oz; Min Operating Temperature: -65°C; Max Operating Temperature: 175°C; Packaging: Rail/Tube; Package Quantity: 50; Reverse Voltage (DC): 45V; Average Rectified Current: 20A; Max Repetitive Reverse Voltage (Vrrm): 45V; Peak Non-Repetitive Surge Current: 275A; Max Reverse Voltage (DC): 45V; Radiation Hardening: No; Lead Free: Lead Free; ComponentLink1URL: http://www.st.com/content/ccc/resource/sales_and_marketing/promotional_material/selection_guide/38/a9/c4/c4/46/f9/40/ff/sgdiodrect0413.pdf/files/sgdiodrect0413.pdf/jcr:content/translations/en.sgdiodrect0413.pdf; ComponentLink1Description: http://www.st.com/content/ccc/resource/sales_and_marketing/promotional_material/selection_guide/38/a9/c4/c4/46/f9/40/ff/sgdiodrect0413.pdf/files/sgdiodrect0413.pdf/jcr:content/translations/en.sgdiodrect0413.pdf; Case/Package: TO-220AB
footprint TO-220AB
pins: 1 A1, 2 C, 3 A2

## D-MBRS2040-SMB
designator D?, comment MBRS2040  Average Rectified Current: 2A  Case/Package: SMB
DIODE SCHOTTKY 40V 2A SMB; Manufacturer: ON Semiconductor; Manufacturer Part Number: MBRS2040LT3G; Max Surge Current: 70A; Forward Voltage: 430mV; Peak Reverse Current: 800uA; Element Configuration: Single; Polarity: Standard; Washability: OK; Supplier 1: Digi-Key; Supplier Part Number 1: MBRS2040LT3GOSDKR-ND; Stock 1: 41045; Pricing 1: 1=0.43, 10=0.346, 100=0.2353, 500=0.17648, 1000=0.13236 (USD); Number of Pins: 2; Contact Plating: Matte,Tin; Min Operating Temperature: -55°C; Max Operating Temperature: 125°C; Package Quantity: 1; Forward Current: 2A; Packaging: Tape and Reel; Max Reverse Leakage Current: 800uA; Max Repetitive Reverse Voltage (Vrrm): 40V; Max Forward Surge Current (Ifsm): 70A; Peak Non-Repetitive Surge Current: 70A; Voltage Rating (DC): 40V; Current Rating: 2A; Output Current: 2A; Max Reverse Voltage (DC): 40V; Length: 4.32mm; Height: 2.13mm; Width: 3.56mm; Radiation Hardening: No; REACH SVHC: No SVHC; Lead Free: Lead Free; Halogen Free: Halogen Free; ComponentLink1URL: http://www.onsemi.com/pub/Collateral/MBRS2040LT3-D.PDF; ComponentLink1Description: http://www.onsemi.com/pub/Collateral/MBRS2040LT3-D.PDF; ComponentLink2URL: https://www.verical.com/server-webapp/html/getDatasheet?partID=94183; ComponentLink2Description: https://www.verical.com/server-webapp/html/getDatasheet?partID=94183; ComponentLink3URL: http://www.farnell.com/datasheets/1708278.pdf; ComponentLink3Description: http://www.farnell.com/datasheets/1708278.pdf; ComponentLink4URL: http://www.mouser.com/ds/2/308/MBRS2040LT3-D-103729.pdf; ComponentLink4Description: http://www.mouser.com/ds/2/308/MBRS2040LT3-D-103729.pdf; ComponentLink5URL: http://www.jameco.com/Jameco/Products/ProdDS/926014.pdf; ComponentLink5Description: http://www.jameco.com/Jameco/Products/ProdDS/926014.pdf
footprint D-SMB-DO214AA
pins: A, C

## D-MM3Z3V3B
designator D?, comment MM3Z3V3B  Package: SOD323  Zener Voltage: 3.3V
DIODE ZENER 3.3V 200MW SOD323F; Manufacturer: ON Semiconductor / Fairchild; Forward Voltage: 1V; Tolerance: 2%; Impedance: 89R; Max Reverse Leakage Current: 4.5uA; Test Current: 5mA; Element Configuration: Single; Washability: OK; Supplier 1: Digi-Key; Manufacturer Part Number: MM3Z3V3B; Stock 1: 427658; Pricing 1: 1=0.22, 10=0.18, 100=0.0956, 500=0.06288, 1000=0.04276 (USD); Mount: Surface Mount; Number of Pins: 2; Weight: 0.0276g; Min Operating Temperature: -65°C; Max Operating Temperature: 150°C; Packaging: Tape and Reel; Package Quantity: 1; Max Power Dissipation: 200mW; Voltage Tolerance: 2%; Power Dissipation: 200mW; Working Voltage: 3.3V; Peak Reverse Current: 4.5uA; Length: 1.3mm; Height: 1mm; Width: 1.7mm; Radiation Hardening: No; REACH SVHC: No SVHC; Lead Free: Lead Free; ComponentLink1URL: http://www.onsemi.com/pub/Collateral/MM3Z9V1B-D.pdf; ComponentLink1Description: http://www.onsemi.com/pub/Collateral/MM3Z9V1B-D.pdf; ComponentLink2URL: http://www.mouser.com/ds/2/149/MM3Z3V3B-187166.pdf; ComponentLink2Description: http://www.mouser.com/ds/2/149/MM3Z3V3B-187166.pdf; ComponentLink3URL: https://www.fairchildsemi.com/datasheets/MM/MM3Z9V1B.pdf; ComponentLink3Description: https://www.fairchildsemi.com/datasheets/MM/MM3Z9V1B.pdf; ComponentLink4URL: http://www.farnell.com/datasheets/1706525.pdf; ComponentLink4Description: http://www.farnell.com/datasheets/1706525.pdf; Supplier Part Number 1: MM3Z3V3BDKR-ND
footprint D-SOD323
pins: A, C

## D-MMSZ5231B-SOD123
designator D?, comment MMSZ5231B  Zener Voltage: 5.1V  Case/Package: SOD-123-2
DIODE ZENER 5.1V 500MW SOD123; Manufacturer: MCC; Manufacturer Part Number: MMSZ5231B-TP; Tolerance: 5%; Forward Voltage: 900mV; Impedance: 17R; Max Reverse Leakage Current: 5uA; Test Current: 20mA; Element Configuration: Single; Washability: OK; Supplier 1: Digi-Key; Supplier Part Number 1: MMSZ5231B-TPMSDKR-ND; Stock 1: 176731; Pricing 1: 1=0.22, 10=0.203, 25=0.146, 100=0.1136, 250=0.07136, 500=0.06084, 1000=0.04137 (USD); Mount: Surface Mount; Number of Pins: 2; Min Operating Temperature: -55°C; Max Operating Temperature: 150°C; Package Quantity: 1; Packaging: Tape and Reel; Max Power Dissipation: 500mW; Power Dissipation: 500mW; Voltage Tolerance: 5%; Working Voltage: 5.1V; Peak Reverse Current: 5uA; REACH SVHC: Unknown; Lead Free: Lead Free; ComponentLink1URL: http://www.mccsemi.com/up_pdf/MMSZ5221-MMSZ5267(SOD123)-J.pdf; ComponentLink1Description: http://www.mccsemi.com/up_pdf/MMSZ5221-MMSZ5267(SOD123)-J.pdf; ComponentLink2URL: http://www.mccsemi.com/up_pdf/MMSZ5221-MMSZ5259(SOD123).pdf; ComponentLink2Description: http://www.mccsemi.com/up_pdf/MMSZ5221-MMSZ5259(SOD123).pdf; ComponentLink3URL: http://www.mccsemi.com/up_pdf/MMSZ5221-MMSZ5261(SOD123).pdf; ComponentLink3Description: http://www.mccsemi.com/up_pdf/MMSZ5221-MMSZ5261(SOD123).pdf; Package / Case: SOD-123; Supplier 2: Digi-Key; Supplier Part Number 2: CMHZ5231BDKR-ND; Stock 2: 5951; Pricing 2: 1=0.49, 10=0.415, 25=0.3632, 100=0.3115, 250=0.26996, 500=0.22842, 1000=0.1765 (USD); Supplier 3: Digi-Key; Supplier Part Number 3: MMSZ5231B-HE3-08GIDKR-ND; Stock 3: 16072; Pricing 3: 1=0.3, 10=0.244, 25=0.2044, 100=0.1295, 250=0.09992, 500=0.08516, 1000=0.05791 (USD); Weight: 0.000363oz
footprint D-SOD123
pins: A, C

## D-MMSZ5245B-TP
designator D?, comment MMSZ5245B  Zener Voltage: 15V
DIODE ZENER 15V 500MW SOD123; Manufacturer: MCC; Manufacturer Part Number: MMSZ5245B-TP; Tolerance: 5%; Impedance: 16R; Max Reverse Leakage Current: 100nA; Test Current: 8.5mA; Element Configuration: Single; Supplier 1: Digi-Key; Stock 1: 468578; Pricing 1: 1=0,20000, 10=0,13500, 100=0,07200, 500=0,04126, 1000=0,03000 (USD); RoHS: Yes; Mount: Surface Mount; Number of Pins: 2; Min Operating Temperature: -55°C; Max Operating Temperature: 150°C; Packaging: Tape and Reel; Package Quantity: 1; Max Power Dissipation: 500mW; Power Dissipation: 500mW; Voltage Tolerance: 5%; Lead Free: Lead Free; ComponentLink1URL: https://datasheet.ciiva.com/890/mmsz5221-mmsz5259sod123-890447.pdf?src-supplier=Digi-Key; ComponentLink1Description: https://datasheet.ciiva.com/890/mmsz5221-mmsz5259sod123-890447.pdf?src-supplier=Digi-Key; ComponentLink2URL: https://datasheet.ciiva.com/890/mmsz5221-mmsz5259sod123-890445.pdf?src-supplier=Digi-Key; ComponentLink2Description: https://datasheet.ciiva.com/890/mmsz5221-mmsz5259sod123-890445.pdf?src-supplier=Digi-Key; ComponentLink3URL: https://datasheet.ciiva.com/890/mmsz5221-mmsz5259sod123-890446.pdf?src-supplier=Digi-Key; ComponentLink3Description: https://datasheet.ciiva.com/890/mmsz5221-mmsz5259sod123-890446.pdf?src-supplier=Digi-Key
footprint D-SOD123
pins: A, C